# Altium footprint library FxPcbLib.PcbLib: 112 footprints (part 2 of 7)
Each footprint in its own frame and in the unit in brackets; x right, y up, seen from the top. Pads: shape width x height; smd on the part's side, far side on the other; paste and mask are expansions set on the pad; w line width, h text height; cw(c..) or ccw(c..) is an arc to the next point about the centre after c.
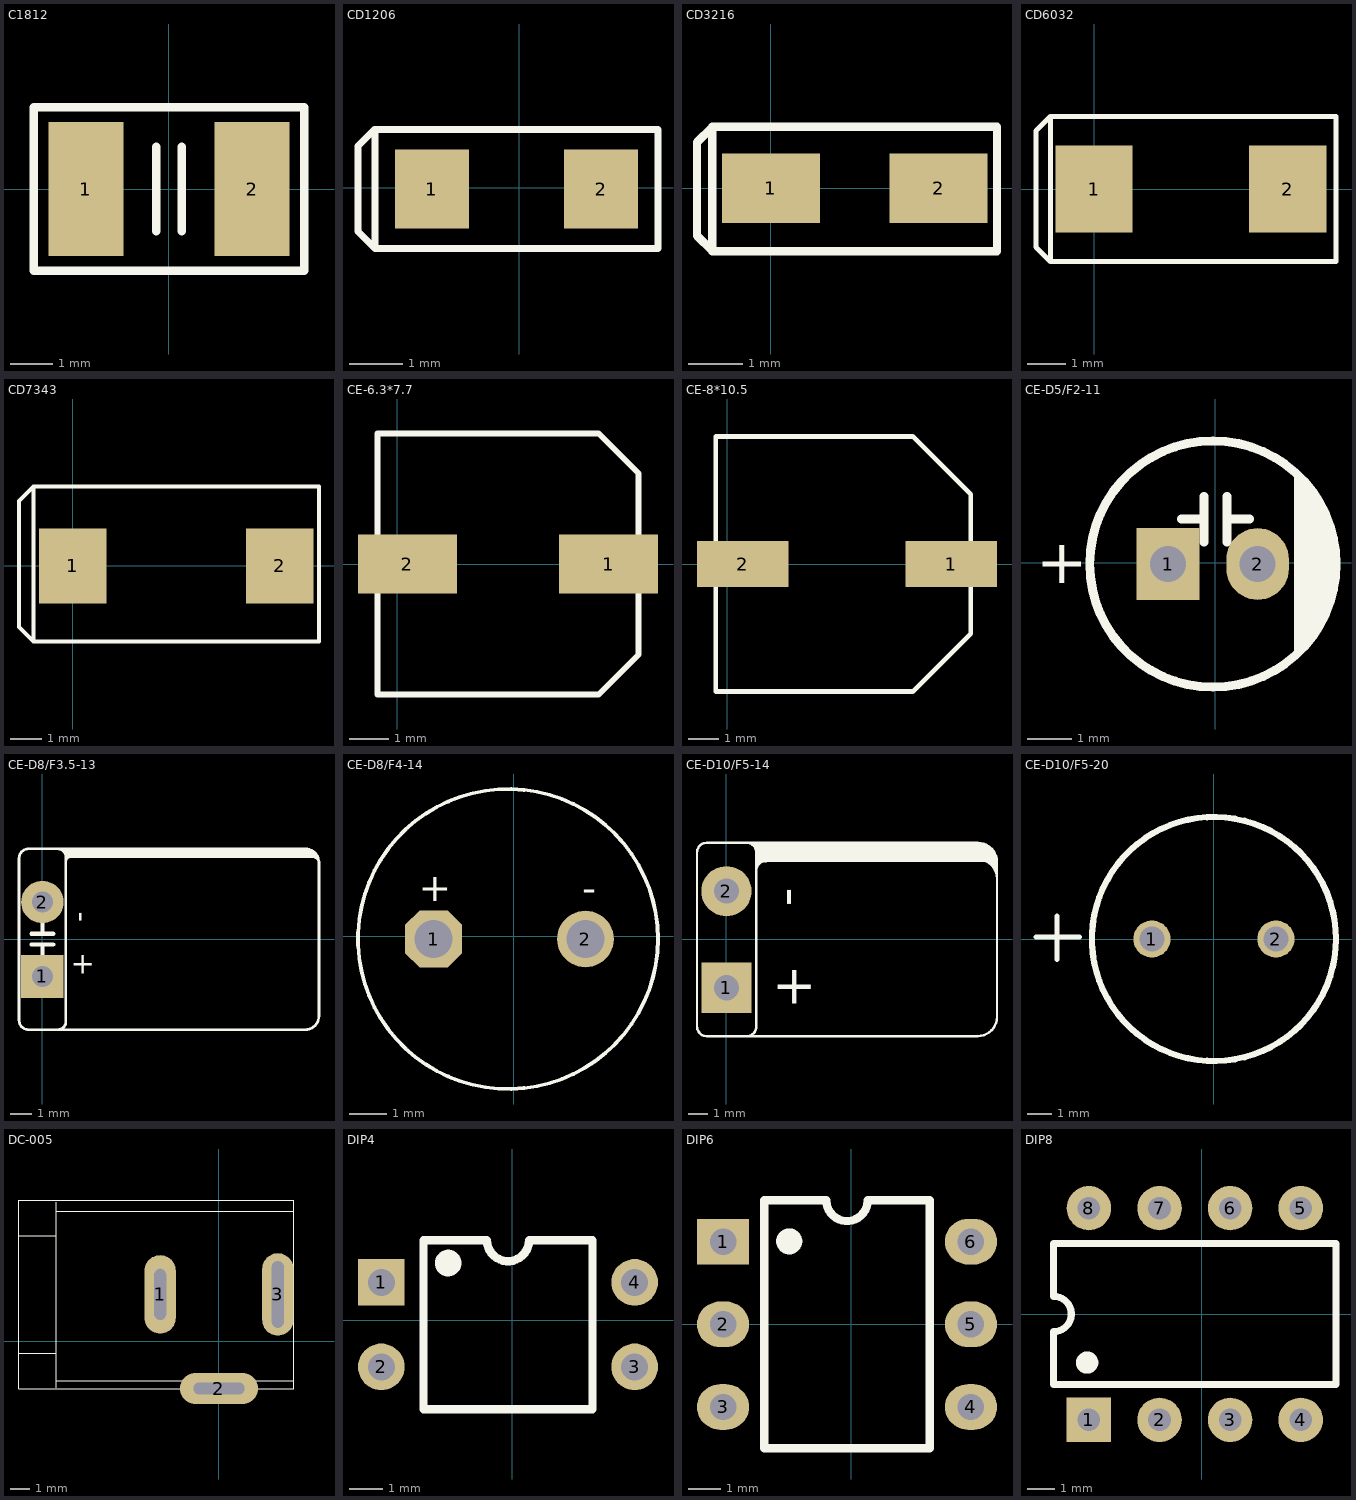
[diagram p1: the footprints below, top view; thin cyan lines are the x and y axes]

## C1812 [mil]
pads (2):
  rect 70x125 smd: 1(-77.5,0) 2(77.5,0)
Top Overlay:
  lines w7.87: -11.81,-39.37 -11.81,39.37 ; 11.81,-39.37 11.81,39.37 ; -126.28,-76.26 126.28,-76.26 126.28,76.26 -126.28,76.26 -126.28,-76.26
3D body: height 48.82, standoff 0, extent -88.58,-65 88.58,60.98

## CD1206 [mm]
pads (2):
  rect 1.4x1.5 smd: 1(-1.651,-0.025) 2(1.549,-0.025)
Top Overlay:
  lines w0.127: -2.388,1.1 -2.736,1.1 -3.048,0.787 -3.048,-0.828 -2.726,-1.15 ; -2.726,-1.15 2.624,-1.15 2.624,1.1 -2.726,1.1 -2.726,-1.15
3D body: height 1.65, standoff 0, extent -1.771,-0.813 1.619,0.787

## CD3216 [mm]
pads (2):
  rect 1.78x1.27 smd: 1(0,0) 2(3.05,0)
Top Overlay:
  lines w0.152: -1.067,-1.143 4.115,-1.143 4.115,1.118 -1.067,1.118 ; -1.067,-1.143 -1.346,-0.864 -1.346,0.838 -1.067,1.118 ; -1.067,-1.143 -1.067,1.118
3D body: height 1.7, standoff 0, extent -0.201,-0.889 3.199,0.911

## CD6032 [mm]
pads (2):
  rect 2.03x2.28 smd: 1(0,0) 2(5.08,0)
Top Overlay:
  lines w0.127: -1.143,-1.905 -1.524,-1.524 -1.524,1.524 -1.143,1.905 ; -1.143,-1.905 -1.143,1.905 ; -1.143,-1.905 6.35,-1.905 6.35,1.905 -1.143,1.905
3D body: height 2.8, standoff 0, extent -0.61,-1.75 5.69,1.75

## CD7343 [mm]
pads (2):
  rect 2.16x2.41 smd: 1(0,0) 2(6.61,0)
Top Overlay:
  lines w0.127: -1.27,-2.413 -1.727,-1.956 -1.727,2.083 -1.27,2.54 ; -1.27,-2.413 7.874,-2.413 7.874,2.54 -1.27,2.54 ; -1.27,-2.413 -1.27,2.54
3D body: height 3.1, standoff 0, extent -0.498,-2.224 7.102,2.376

## CE-6.3*7.7 [mm]
pads (2):
  rect 2.5x1.5 smd: 1(5.334,0) 2(0.254,0)
Top Overlay:
  lines w0.152: -0.508,-3.302 -0.508,3.302 5.08,3.302 6.096,2.286 6.096,-2.286 5.08,-3.302 -0.508,-3.302
3D body: height 8, standoff 0, extent -1.006,-3.3 6.594,3.3

## CE-8*10.5 [mm]
pads (2):
  rect 3x1.5 smd: 1(7.366,0) 2(0.508,0)
Top Overlay:
  lines w0.152: -0.381,-4.191 6.096,-4.191 8.001,-2.286 8.001,2.286 6.096,4.191 -0.381,4.191 -0.381,-4.191
3D body: height 10.31, standoff -0.01, extent -0.791,-4.15 8.509,4.15

## CE-D5/F2-11 [mm]
pads (2):
  rect 1.4x1.6 hole 0.8: 1(-1.051,-0.025)
  oval 1.4x1.6 hole 0.8: 2(0.949,-0.025)
Top Overlay:
  circle w0.2: c-0.051,-0.025 r2.75
  region: 2.599,0.775 2.349,0.775 2.349,-0.575 2.599,-0.575
  region: 2.524,0.95 2.174,0.95 2.174,-1 2.524,-1
  region: 2.674,0.375 2.424,0.375 2.424,-0.65 2.674,-0.65
  region: 2.499,1.125 1.849,1.125 1.849,-1.075 2.499,-1.075
  region: 2.199,-0.975 1.824,-0.975 1.824,-1.575 2.199,-1.575
  region: 2.124,-1.425 1.824,-1.425 1.824,-1.725 2.124,-1.725
  region: 2.024,-1.575 1.824,-1.575 1.824,-1.85 2.024,-1.85
  region: 2.324,-0.9 2.074,-0.9 2.074,-1.45 2.324,-1.45
  region: 2.424,-0.875 2.224,-0.875 2.224,-1.25 2.424,-1.25
  region: 2.374,1.375 1.874,1.375 1.874,0.95 2.374,0.95
  region: 2.224,1.575 1.849,1.575 1.849,1.25 2.224,1.25
  region: 2.074,1.825 1.849,1.825 1.849,1.45 2.074,1.45
  lines w0.127: 1.824,-2 1.824,1.925
  lines w0.2: -0.752,0.975 -0.244,0.975 ; -0.244,0.467 -0.244,1.483 ; 0.264,0.467 0.264,1.483 ; 0.264,0.975 0.772,0.975
  text "+" at -4.001,-0.45 h1
3D body: height 11, standoff -2.5, extent -2.551,-2.515 2.449,2.485

## CE-D8/F3.5-13 [mm]
pads (2):
  rect 2x2 hole 1: 1(0,-1.75)
  round 2 hole 1: 2(0,1.75)
Top Overlay:
  region: 1.15,4.25 1,4.25 1,4.075 1.15,4.075
  region: 12.737,4.063 12.575,4.225 12.413,4.062 12.575,3.9
  region: 12.575,4.225 1.4,4.225 1.4,3.9 12.575,3.9
  region: 1.525,4.275 1.1,4.275 1.1,3.925 1.525,3.925
  region: 12.888,3.963 12.7,4.15 12.587,4.038 12.775,3.85
  region: 12.938,3.913 12.825,4.025 12.737,3.938 12.85,3.825
  region: 12.775,4.025 12.575,4.025 12.575,3.875 12.775,3.875
  lines w0.127: 0.725,-4.25 ccw(c0.725,-3.875) 1.1,-3.875 1.1,3.925 ; 0.725,4.25 cw(c0.725,3.875) 1.1,3.875 12.725,3.875 cw(c12.725,3.6) 13,3.6 ; 1.1,3.675 cw(c1.3,3.675) 1.3,3.875 ; 13,3.6 ccw(c12.35,3.6) 12.35,4.25 0.55,4.25 -0.65,4.25 ccw(c-0.65,3.8) -1.1,3.8 -1.1,-3.8 ccw(c-0.65,-3.8) -0.65,-4.25 0.55,-4.25 12.35,-4.25 ccw(c12.35,-3.6) 13,-3.6 13,3.6
  lines w0.2: -0.508,-0.25 0.508,-0.25 ; -0.508,0.258 0.508,0.258 ; 0,-0.758 0,-0.25 ; 0,0.258 0,0.766
  text "+" at 1.325,-1.625 h1
  text "-" at 2.175,0.8 h1
3D body: height -0.5, standoff -8.5, extent -1.165,-3.937 13.335,4.063

## CE-D8/F4-14 [mil]
pads (2):
  oct 60x60 hole 40: 1(-84.74,-3)
  round 60 hole 40: 2(75.93,-3)
Top Overlay:
  circle w4: c-6,-3 r158.71
  text "-" at 72.74,36.37 h30
  text "+" at -100.19,36.97 h30
3D body: height 566.93, standoff -114.17, extent -167.41,-165.41 155.42,157.42

## CE-D10/F5-14 [mm]
pads (2):
  rect 2.6x2.6 hole 1.3: 1(0,-2.5)
  round 2.6 hole 1.3: 2(0,2.5)
Top Overlay:
  region: 1.8,4.125 1.6,4.125 1.6,4 1.8,4
  region: 1.7,4.15 1.55,4.15 1.55,3.925 1.7,3.925
  region: 1.5,5.05 1.35,5.05 1.35,4.85 1.5,4.85
  region: 1.7,5.025 1.45,5.025 1.45,4.725 1.7,4.725
  region: 14,3.8 13.85,3.8 13.85,3.625 14,3.625
  region: 14,3.925 13.775,3.925 13.775,3.725 14,3.725
  region: 13.8,4.125 13.575,4.125 13.575,3.9 13.8,3.9
  region: 14,4.075 13.7,4.075 13.7,3.825 14,3.825
  region: 13.7,4.25 13.275,4.25 13.275,4.025 13.7,4.025
  region: 13.9,4.475 13.625,4.475 13.625,4.175 13.9,4.175
  region: 13.825,4.6 13.55,4.6 13.55,4.225 13.825,4.225
  region: 13.95,4.35 13.5,4.35 13.5,3.975 13.95,3.975
  region: 13.625,4.825 13.5,4.825 13.5,4.675 13.625,4.675
  region: 13.375,4.95 13.15,4.95 13.15,4.775 13.375,4.775
  region: 13.525,4.875 13.175,4.875 13.175,4.6 13.525,4.6
  region: 13.75,4.725 13.05,4.725 13.05,4.075 13.75,4.075
  region: 13.275,5 12.8,5 12.8,4.1 13.275,4.1
  region: 13,5 1.55,5 1.55,4.05 13,4.05
  lines w0.127: -0.4,-2.95 ccw(c0.05,-2.95) 0.05,-3.4 1.05,-3.4 ; -0.4,1.45 cw(c0.05,1.45) 0.05,1.9 ; 1.55,3.575 cw(c2,3.6) 1.975,4.05 2.05,4.05 ; 2.05,4.075 14,4.075 ; 13,4.15 cw(c13,3.15) 14,3.15 ; 14,3.975 14,4.075 ; 14,4 ccw(c13,4) 13,5 1.05,5 ; 1.05,-5 ccw(c1.05,-4.5) 1.55,-4.5 1.55,4.5 ccw(c1.05,4.5) 1.05,5 ; 1.05,-5 -1.025,-5 cw(c-1.025,-4.5) -1.525,-4.5 -1.525,4.5 cw(c-1.025,4.5) -1.025,5 1.05,5 ; 1.05,-5 13,-5 ccw(c13,-4) 14,-4 14,4.075
  text "+" at 2.375,-3.325 h2
  text "-" at 4,1.7 h2
3D body: height 10, standoff 0, extent -1.038,-5 13.462,5

## CE-D10/F5-20 [mil]
pads (2):
  round 60 hole 40: 1(-100,0) 2(100,0)
Top Overlay:
  circle w10: c0,0 r196.85
  lines w8: -287,3 -217,3 ; -253,-33 -253,37
3D body: height 800, standoff -114.17, extent -199,-197.49 201,201.5

## DC-005 [mm]
pads (3):
  oval 1.6x4 hole 0.6 slot 2.6 at 90 deg: 1(-3,2.4)
  oval 4x1.6 hole 0.6 slot 2.6 at 0 deg: 2(0,-2.4)
  oval 1.6x4.2 hole 0.6 slot 3.4 at 90 deg: 3(3,2.4)
Top Overlay:
  lines w0.025: -10.2,-0.6 -8.35,-0.6 ; -10.2,5.4 -8.3,5.4 ; -8.3,-2.35 -8.3,7.1 ; -8.3,-2 3.8,-2 ; -8.3,6.65 3.8,6.65 ; -10.2,-2.4 -10.2,7.2 3.8,7.2 3.8,-2.4 -10.2,-2.4
3D body: height 11.2, standoff -3.4, extent -10.769,-2.396 3.731,7.154

## DIP4 [mil]
pads (4):
  rect 55.12x55.12 hole 32: 1(-155,45)
  round 55.12 hole 32: 2(-155,-55) 3(145,-55) 4(145,45)
Top Overlay:
  circle w19.68: c-75.87,67.83 r5.91
  lines w10: -105,-105 -105,95 -30,95 ccw(c-5,95) 20,95 95,95 95,-105 -105,-105
3D body: height 169.69, standoff -129.13, extent -157.48,-115 157.48,103.11

## DIP6 [mm]
pads (6):
  rect 1.6x1.4 hole 0.813: 1(-3.937,2.54)
  oval 1.6x1.4 hole 0.813: 2(-3.937,0) 3(-3.937,-2.54) 4(3.683,-2.54) 5(3.683,0) 6(3.683,2.54)
Top Overlay:
  circle w0.5: c-1.902,2.55 r0.15
  lines w0.254: -2.667,-3.81 -2.667,3.81 -0.762,3.81 ccw(c-0.127,3.81) 0.508,3.81 2.413,3.81 2.413,-3.81 -2.667,-3.81
3D body: height 4.31, standoff -3.28, extent -4.08,-4.278 3.92,3.802

## DIP8 [mm]
pads (8):
  rect 1.6x1.6 hole 0.813: 1(-4.064,-3.81)
  round 1.6 hole 0.813: 2(-1.524,-3.81) 3(1.016,-3.81) 4(3.556,-3.81) 5(3.556,3.81) 6(1.016,3.81) 7(-1.524,3.81) 8(-4.064,3.81)
Top Overlay:
  circle w0.5: c-4.129,-1.75 r0.15
  lines w0.254: -5.334,-2.54 4.826,-2.54 4.826,2.54 -5.334,2.54 -5.334,0.635 cw(c-5.334,0) -5.334,-0.635 -5.334,-2.54
3D body: height 5.08, standoff -3.5, extent -5.781,-4.027 5.139,3.843